# Altium footprint library CADTlink.PcbLib: 143 footprints (part 8 of 9)
Each footprint in its own frame and in the unit in brackets; x right, y up, seen from the top. Pads: shape width x height; smd on the part's side, far side on the other; paste and mask are expansions set on the pad; w line width, h text height; cw(c..) or ccw(c..) is an arc to the next point about the centre after c.
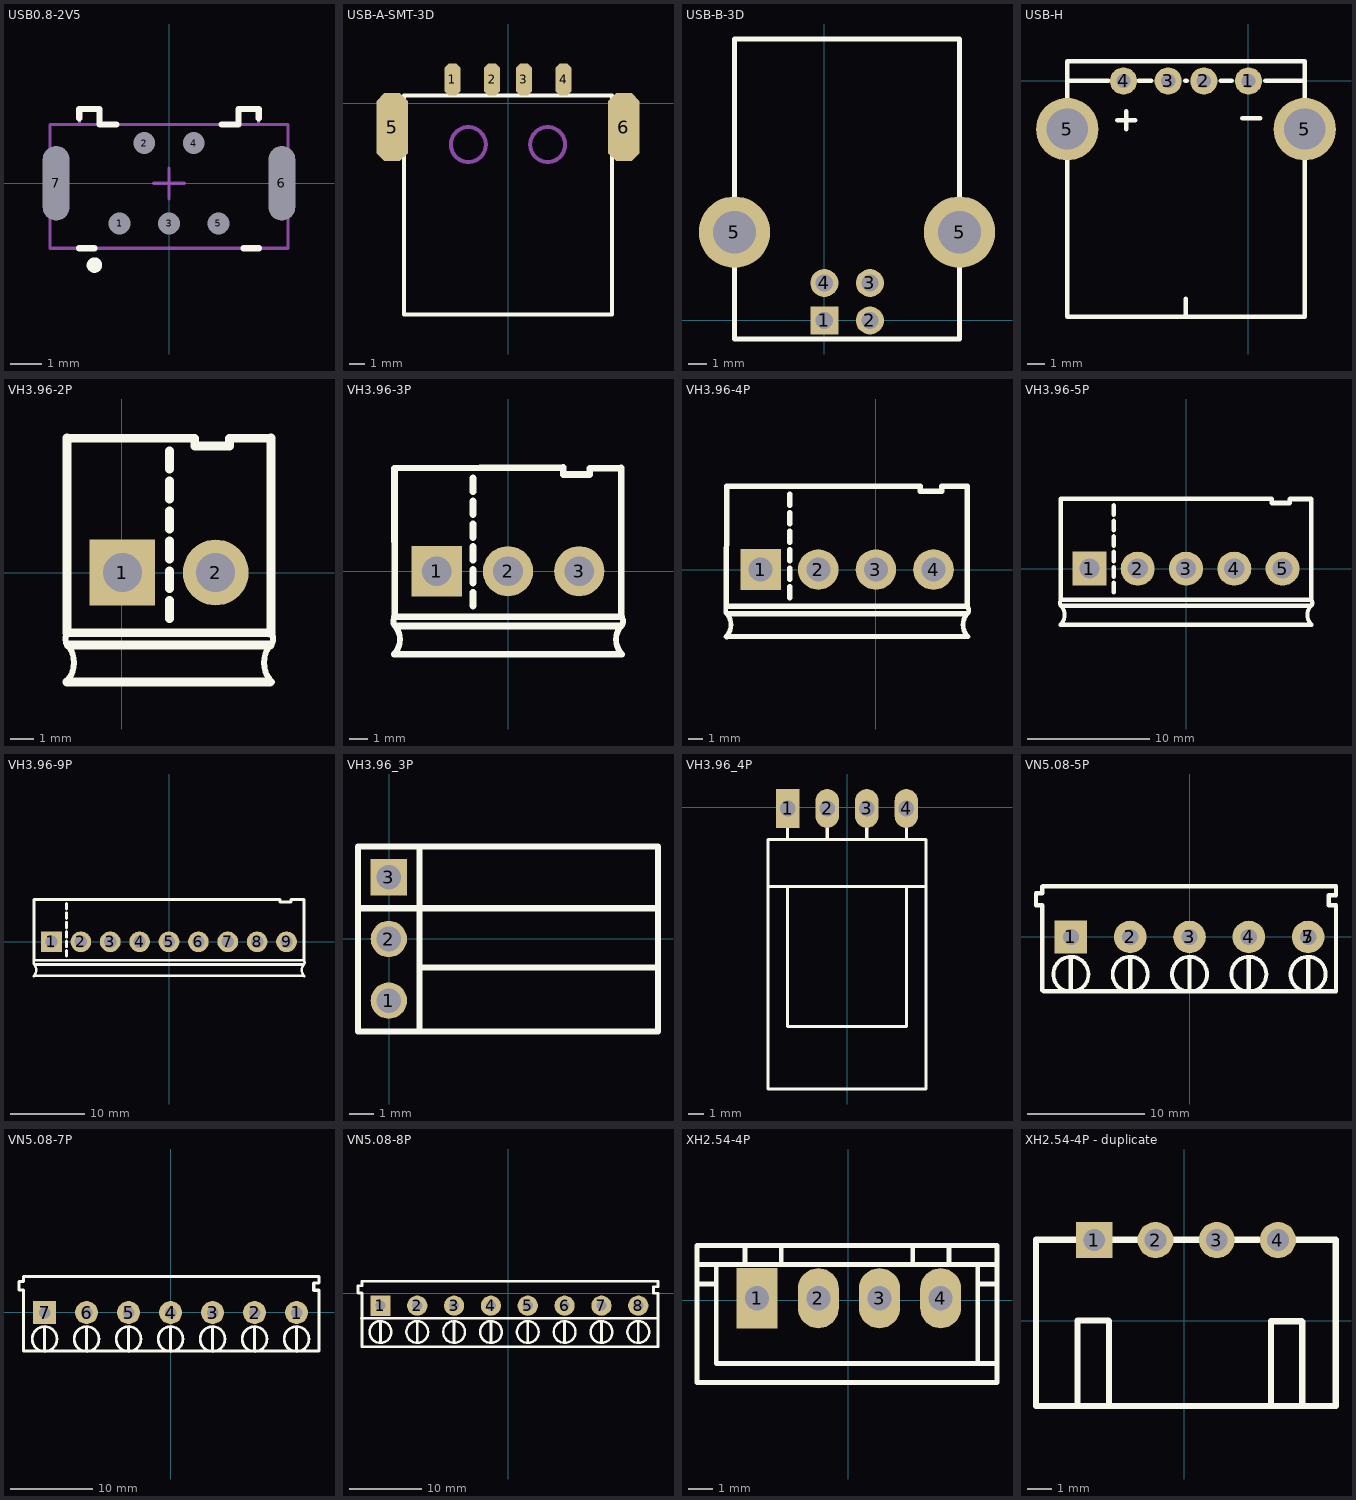
[diagram p7: the footprints below, top view; thin cyan lines are the x and y axes]

## USB0.8-2V5 [mm] "Connector; USB Mini-B, Type 2, Thru-Hole; 5 Position; Vertical"
height 7.7
pads (7):
  round 0.4 / inner round 0.4 / far side oval 1.1x1.7 hole 0.7: 1(-1.6,-1.3) 2(-0.8,1.3) 3(0,-1.3) 4(0.8,1.3) 5(1.6,-1.3)
  oval 0.55x2.1 / inner oval 0.55x2.1 / far side oval 1.6x3.9 hole 0.85 slot 2.4 at 90 deg: 6(3.65,0) 7(-3.65,0)
Top Overlay:
  circle w0.25: c-2.41,-2.645 r0.125
  lines w0.2: -2.91,-2.1 -2.41,-2.1 ; -2.9,2.1 -2.9,2.4 -2.25,2.4 -2.25,1.9 -1.7,1.9 ; 1.7,1.9 2.25,1.9 2.25,2.4 2.9,2.4 2.9,2.1 ; 2.41,-2.1 2.91,-2.1
Mechanical 13:
  lines w0.1: -2.9,1.9 -2.9,2.4 -2.25,2.4 -2.25,1.9 ; 2.25,1.9 2.25,2.4 2.9,2.4 2.9,1.9 ; -3.85,-2.1 -3.85,1.9 3.85,1.9 3.85,-2.1 -3.85,-2.1
Mechanical 15:
  lines w0.1: -0.5,0 0.5,0 ; 0,-0.5 0,0.5
3D body: height 7.7, standoff 0, extent -2.899,1.901 -2.251,2.399
3D body: height 7.7, standoff 0, extent 2.251,1.901 2.899,2.399
3D body: height 7.7, standoff 0, extent -3.849,-2.099 3.849,1.899

## USB-A-SMT-3D [mm]
pads (6):
  oct 1x2 smd: 1(-3.5,1.5) 2(-1,1.5) 3(1,1.5) 4(3.5,1.5)
  oct 2x4.3 smd: 5(-7.3,-1.5) 6(7.3,-1.5)
Top Overlay:
  lines w0.254: -6.55,-13.3 -6.55,0.5 6.55,0.5 6.55,-13.3 -6.55,-13.3
Mechanical 1:
  circle w0.254: c-2.5,-2.6 r1.1
  circle w0.254: c2.5,-2.6 r1.1
3D body: height 6.35, standoff -1.53, extent -7.289,-13.267 7.311,1.863

## USB-B-3D [mm]
pads (6):
  rect 1.5x1.5 hole 0.92: 1(0,0)
  round 1.5 hole 0.92: 2(2.43,0) 3(2.43,2) 4(0,2)
  round 3.8 hole 2.28: 5(-4.793,4.713) 5(7.207,4.713)
Top Overlay:
  lines w0.254: -4.793,-0.987 -4.793,15.013 7.207,15.013 7.207,-0.987 -4.793,-0.987
3D body: height 3.13, standoff -11.09, extent -6.134,-0.914 8.725,15.386

## USB-H [mm]
pads (6):
  round 1.524 hole 0.8: 1(0,0) 2(-2.5,0) 3(-4.5,0) 4(-7,0)
  round 3.5 hole 2.3: 5(-10.15,-2.7) 5(3.15,-2.7)
Top Overlay:
  lines w0.254: -10.15,0 -7.85,0 ; -7.35,-2.2 -6.35,-2.2 ; -6.85,-2.7 -6.85,-1.7 ; -6.15,0 -5.45,0 ; -3.55,0 -3.45,0 ; -3.51,-13.2 -3.51,-12.2 ; -1.55,0 -0.95,0 ; -0.35,-2.1 0.65,-2.1 ; 0.95,0 3.15,0 ; -10.15,-13.2 3.15,-13.2 3.15,1.1 -10.15,1.1 -10.15,-13.2
3D body: height 7.55, standoff -3.3, extent -11.405,-13.06 4.395,1.1

## VH3.96-2P [mil]
pads (2):
  rect 110x110 hole 65: 1(0.59,0)
  round 110 hole 65: 2(156.59,0)
Top Overlay:
  lines w10: -93.41,-183 ccw(c-125.91,-150.5) -93.41,-118 ; -90.41,-121 cw(c-79.41,-111) -89.41,-100 ; 247.59,-122 ccw(c237.59,-111) 248.59,-101 ; 250.59,-183 cw(c283.09,-150.5) 250.59,-118
  lines w15: -91.91,-182.5 247.09,-182.5 ; -91.91,-100.5 247.59,-101 ; -91.41,-101 -91.91,224.5 121.59,224 121.59,211 179.59,211 179.59,224 248.59,225 248.59,-101 ; -89.41,-121 247.59,-121 ; 79.59,-77 79.59,-47 ; 79.59,-27 79.59,3 ; 79.59,23 79.59,53 ; 79.59,73 79.59,103 ; 79.59,123 79.59,153 ; 79.59,173 79.59,203

## VH3.96-3P [mil]
pads (3):
  rect 110x110 hole 65: 1(-156,0)
  round 110 hole 65: 2(0,0) 3(156,0)
Top Overlay:
  lines w13: -250,-182 ccw(c-282.5,-149.5) -250,-117 ; -247,-120 cw(c-236,-110) -246,-99 ; 247,-121 ccw(c237,-110) 248,-100 ; 250,-182 cw(c282.5,-149.5) 250,-117
  lines w15: -248.5,-181.5 249,-182 ; -248.5,-99.5 249,-100 ; -248,-100 -248.5,225.5 121,227 ; -246,-120 246,-120 ; -77,-76 -77,-46 ; -77,-26 -77,4 ; -77,24 -77,54 ; -77,74 -77,104 ; -77,124 -77,154 ; -77,174 -77,204 ; 121,225 121,212 179,212 179,225 248,226 248,-100

## VH3.96-4P [mil]
pads (4):
  rect 110x110 hole 65: 1(-312,0)
  round 110 hole 65: 2(-156,0) 3(0,0) 4(156,0)
Top Overlay:
  lines w13: -406,-182 ccw(c-438.5,-149.5) -406,-117 ; -403,-120 cw(c-392,-110) -402,-99 ; 246.49,-121 ccw(c236.49,-110) 247.49,-100 ; 249.49,-182 cw(c281.99,-149.5) 249.49,-117
  lines w15: -405,-100 -404.5,225.5 120.49,225.11 ; -404.5,-181.5 245.08,-181.1 ; -404.5,-99.5 247.49,-99.9 ; -402,-120 246.49,-120 ; -233,-76 -233,-46 ; -233,-26 -233,4 ; -233,24 -233,54 ; -233,74 -233,104 ; -233,124 -233,154 ; -233,174 -233,204 ; 120.49,225 120.49,212 178.49,212 178.49,225 247.49,225 247.49,-100

## VH3.96-5P [mil]
pads (5):
  rect 110x110 hole 65: 1(-312,0)
  round 110 hole 65: 2(-156,0) 3(0,0) 4(156,0) 5(312,0)
Top Overlay:
  lines w13: -406,-182 ccw(c-438.5,-149.5) -406,-117 ; -403,-120 cw(c-392,-110) -402,-99 ; 403,-121 ccw(c393,-110) 404,-100 ; 406,-182 cw(c438.5,-149.5) 406,-117
  lines w15: -405,-100 -404.5,225.5 277,225 277,212 335,212 335,225 404,225 404,-100 ; -404.5,-181.5 405,-181 ; -404.5,-99.5 405,-100 ; -402,-120 403,-120 ; -233,-76 -233,-46 ; -233,-26 -233,4 ; -233,24 -233,54 ; -233,74 -233,104 ; -233,124 -233,154 ; -233,174 -233,204

## VH3.96-9P [mil]
pads (9):
  rect 110x110 hole 65: 1(-624.8,0)
  round 110 hole 65: 2(-468.8,0) 3(-312.8,0) 4(-156.8,0) 5(-0.8,0) 6(155.2,0) 7(311.2,0) 8(467.2,0) 9(623.2,0)
Top Overlay:
  lines w13: -718.8,-182 ccw(c-751.3,-149.5) -718.8,-117 ; -715.8,-120 cw(c-704.8,-110) -714.8,-99 ; 714.2,-121 ccw(c704.2,-110) 715.2,-100 ; 717.2,-182 cw(c749.7,-149.5) 717.2,-117
  lines w15: -717.8,-100 -717.3,225.5 589.2,224 ; -717.3,-181.5 714.2,-179 ; -717.3,-99.5 716.2,-98 ; -714.8,-120 713.2,-120 ; -545.8,-76 -545.8,-46 ; -545.8,-26 -545.8,4 ; -545.8,24 -545.8,54 ; -545.8,74 -545.8,104 ; -545.8,124 -545.8,154 ; -545.8,174 -545.8,204 ; 588.2,225 588.2,212 646.2,212 646.2,225 715.2,225 715.2,-100

## VH3.96_3P [mm]
pads (3):
  round 1.5 hole 1.016: 1(-0.01,-2.545) 2(-0.01,-0.005)
  rect 1.5x1.5 hole 1.016: 3(-0.01,2.535)
Top Overlay:
  lines w0.254: -1.28,1.265 1.26,1.265 ; 0.74,1.265 11.05,1.265 ; 0.84,-3.815 11.09,-3.815 11.09,3.805 0.89,3.805 ; 1.26,-1.175 11.03,-1.175 ; -1.28,-3.815 1.26,-3.815 1.26,3.805 -1.28,3.805 -1.28,-3.815

## VH3.96_4P [mm]
pads (4):
  rect 1.5x2.5 hole 1: 1(-3.81,-0.076)
  oval 1.5x2.5 hole 1: 2(-1.27,-0.076) 3(1.27,-0.076) 4(3.81,-0.076)
Top Overlay:
  lines w0.2: -5.08,-5.076 5.08,-5.076 ; -3.81,-5.076 -3.81,-14.076 3.81,-14.076 3.81,-5.076 ; -3.81,-2.076 -3.81,-0.076 ; -1.27,-2.076 -1.27,-0.076 ; 1.27,-2.076 1.27,-0.076 ; 3.81,-2.076 3.81,-0.076 ; -5.08,-18.076 -5.08,-2.076 5.08,-2.076 5.08,-18.076 -5.08,-18.076

## VN5.08-5P [mil]
height 43.31
pads (6):
  rect 110x110 hole 55: 1(-400,0)
  round 110 hole 55: 2(-200,0) 3(0,0) 4(200,0) 5(400,0) 7(400,0)
Top Overlay:
  circle w13: c-400,-126 r59.06
  circle w13: c-200,-126 r59.06
  circle w13: c0,-126 r59.06
  circle w13: c200,-126 r59.06
  circle w13: c400,-126 r59.06
  circle w13: c400,-126 r59.06
  circle w13: c400,-126 r59.06
  lines w15: -496,147.21 -517.76,147.21 -517.76,107.21 -496,107.21 -496,43.46 -496,-180 -492.21,-183.79 494,-183.79 494,106.21 469.12,106.21 469.12,141.09 492.24,141.09 ; -496,149.03 -496,170.21 -495,171.21 494,171.21 494,141.09 ; -400,-175.79 -400,-75.79 ; -200,-175.79 -200,-75.79 ; 0,-175.79 0,-75.79 ; 200,-175.79 200,-75.79 ; 400,-175.79 400,-75.79 ; 400,-175.79 400,-75.79 ; 400,-175.79 400,-75.79

## VN5.08-7P [mil]
pads (7):
  round 110 hole 55: 1(600,-1) 2(400,-1) 3(200,-1) 4(0,-1) 5(-200,-1) 6(-400,-1)
  rect 110x110 hole 55: 7(-600,-1)
Top Overlay:
  circle w13: c600,-127 r59.06
  circle w13: c600,-127 r59.06
  circle w13: c400,-127 r59.06
  circle w13: c200,-127 r59.06
  circle w13: c0,-127 r59.06
  circle w13: c-200,-127 r59.06
  circle w13: c-400,-127 r59.06
  circle w13: c-600,-127 r59.06
  lines w15: -700,-184.79 707,-184.79 707,105.21 682.12,105.21 682.12,140.09 705.24,140.09 ; -700,-181 -700,42.46 -700,106.21 -721.76,106.21 -721.76,146.21 -700,146.21 ; -700,148.03 -700,170.21 704.24,170.21 ; -600,-176.79 -600,-76.79 ; -400,-176.79 -400,-76.79 ; -200,-176.79 -200,-76.79 ; 0,-176.79 0,-76.79 ; 200,-176.79 200,-76.79 ; 400,-176.79 400,-76.79 ; 707,140.09 707,170.21 ; 600,-176.79 600,-76.79 600,-176.79

## VN5.08-8P [mil]
height 43.31
pads (8):
  rect 110x110 hole 55: 1(-694.24,-67.21)
  round 110 hole 55: 2(-494.24,-67.21) 3(-294.24,-67.21) 4(-94.24,-67.21) 5(105.76,-67.21) 6(305.76,-67.21) 7(505.76,-67.21) 8(705.76,-67.21)
Top Overlay:
  circle w13: c705.76,-210.21 r59.06
  circle w13: c505.76,-210.21 r59.06
  circle w13: c305.76,-210.21 r59.06
  circle w13: c105.76,-210.21 r59.06
  circle w13: c-94.24,-210.21 r59.06
  circle w13: c-294.24,-210.21 r59.06
  circle w13: c-494.24,-210.21 r59.06
  circle w13: c-694.24,-210.21 r59.06
  lines w15: -797.24,-136.21 809.76,-136.21 ; -794.24,-1.56 -794.24,-23.75 -794.24,-290 812.76,-290 812.76,0 787.88,0 787.88,34.88 811,34.88 ; -794.24,1 -816,1 -816,41 -794.24,41 ; -794.24,42.81 -794.24,65 812.76,65 812.76,34.88 ; -694.24,-260 -694.24,-160 ; -494.24,-260 -494.24,-160 ; -294.24,-260 -294.24,-160 ; -94.24,-260 -94.24,-160 ; 105.76,-260 105.76,-160 ; 305.76,-260 305.76,-160 ; 505.76,-260 505.76,-160 ; 705.76,-260 705.76,-160

## XH2.54-4P [mm]
pads (4):
  rect 1.7x2.5 hole 1 square: 1(-3.775,0.076)
  oval 1.7x2.5 hole 1: 2(-1.235,0.076) 3(1.305,0.076) 4(3.845,0.076)
Top Overlay:
  lines w0.2: -6.275,0.671 -5.475,0.671 ; -6.275,1.471 6.185,1.471 ; -5.475,1.471 -5.475,-2.629 6.185,-2.629 ; -4.275,1.471 -4.275,2.261 ; -2.775,1.496 -2.775,2.261 ; 2.685,1.496 2.685,2.261 ; 4.185,1.471 4.185,2.261 ; 5.385,-2.629 5.385,1.471 ; 5.385,0.671 6.185,0.671 ; -6.275,-3.429 -6.275,2.271 6.185,2.271 6.185,-3.429 -6.275,-3.429

## XH2.54-4P - duplicate [mm]
pads (4):
  rect 1.5x1.5 hole 0.9: 1(-3.728,3.353)
  round 1.5 hole 0.9: 2(-1.188,3.353) 3(1.352,3.353) 4(3.892,3.353)
Top Overlay:
  lines w0.254: -6.148,-3.527 6.302,-3.527 ; -6.14,-3.533 -6.14,3.353 ; -6.14,3.363 -4.426,3.363 ; -4.418,-3.457 -4.418,0.013 -3.138,0.013 -3.118,-0.007 -3.118,-3.397 ; -3.026,3.363 3.084,3.363 ; 3.602,-3.487 3.602,-0.017 4.882,-0.017 4.902,-0.037 4.902,-3.427 ; 4.524,3.363 6.292,3.363 ; 6.292,-3.536 6.292,3.353
3D body: height 5.76, standoff -2.79, extent -6.098,-3.89 6.402,3.81